# Altium integrated library Mastermind Devices.IntLib: 910 symbols (part 2 of 6) (continued)
## HC-ZH1.5-6AW
designator CN?
1x6P 6P P=1.5mm Wire To Board Connector ROHS; Manufacturer: HCTL(华灿天禄); Add into BOM: yes; Pitch: 1.5mm; Reference Series: ZH; Number of PINs Per Row: 6; Current Rating (Max): 1A; Rated Voltage (Max): 100V; Plastic Material: PBT; Flame Retardant Rating: UL94V-0; Supplementary Features: K-leg punch; Z-Height of the Board: 3.7mm; X-Length of Bottom Edge on Board (Spacing Line): 10.5mm; Symbol: HC-ZH1.5-6AW; Device: HC-ZH1.5-6AW; LCSC Part Name: 1x6P 间距:1.5mm 弯插 系列:ZH; Supplier Part: C2845569; Manufacturer Part: HC-ZH1.5-6AW; Supplier Footprint: 弯插,P=1.5mm; JLCPCB Part Class: Extended Part; Datasheet: https://atta.szlcsc.com/upload/public/pdf/source/20230711/CEA84C90BC30863458C9BDB0466F53F6.pdf; Supplier: LCSC; Convert to PCB: yes; Pins Structure: 1x6P; Mounting Style: Bend insert; Number of Pins: 6P; Number of Rows: 1; Row Spacing: -; Contact Material: Brass; Contact Plating: Tin; Operating Temperature Range: -25℃~+85℃; Colour: -; Y-Width of Bottom Edge on Board: -
footprint CONN-TH_6P-P1.50_HCTL_C-ZH1.5-6AW
3D model CONN-TH_6P-P1.50_HCTL_C-ZH1.5-6AW
pins: 1, 2, 3, 4, 5, 6

## HCPL3120
designator U?
Opto Gate Driver; Manufacturer: TOSHIBA; Manufacturer Part: TLP250(TP1,F); Supplier: LCSC; Supplier Part: C41664; spicePre: U; spiceSymbolName: TLP250(TP1,F)
footprint DIL08-ROUND
pins: 1, 2, 3, 4, 5 GND, 6, 7, 8 VCC

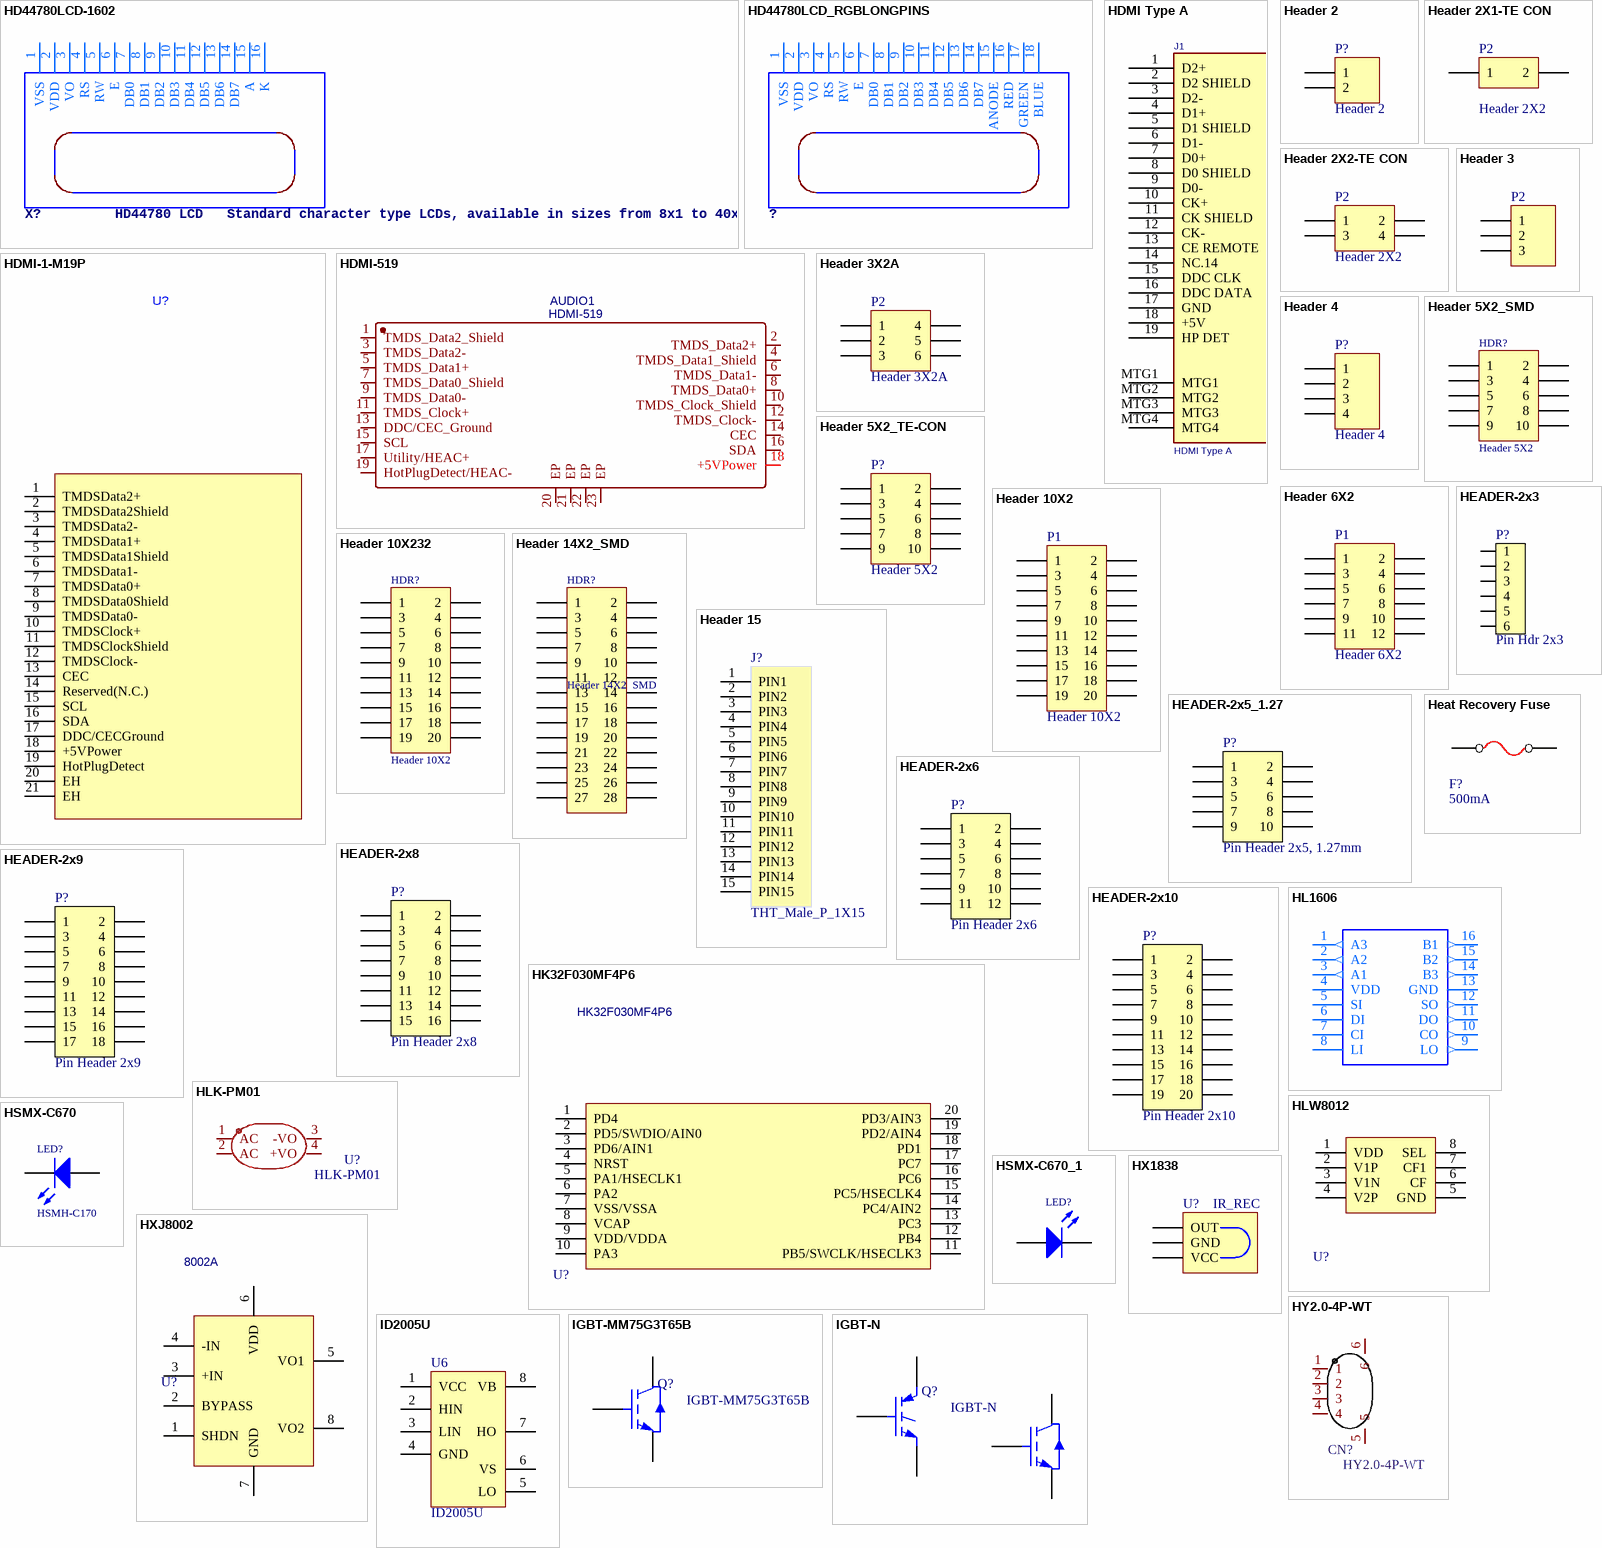
[diagram p14: symbols HD44780LCD-1602 to IGBT-N]

## HD44780LCD-1602
designator X?, comment HD44780 LCD   Standard character type LCDs, available in sizes from 8x1 to 40x4!
footprint LCD1602
pins: 1 VSS (oe), 2 VDD (oe), 3 VO, 4 RS, 5 RW, 6 E, 7 DB0, 8 DB1, 9 DB2, 10 DB3, 11 DB4, 12 DB5, 13 DB6, 14 DB7, 15 A, 16 K

## HD44780LCD_RGBLONGPINS
designator ?
footprint LCD1602-RGB
pins: 1 VSS (oe), 2 VDD (oe), 3 VO, 4 RS, 5 RW, 6 E, 7 DB0, 8 DB1, 9 DB2, 10 DB3, 11 DB4, 12 DB5, 13 DB6, 14 DB7, 15 ANODE, 16 RED, 17 GREEN, 18 BLUE

## HDMI Type A
designator J1
CONN RCPT 19POS HDMI RT ANG SMD; Manufacturer: Molex Connector Corporation; Manufacturer Part Number: 47151-0001; .Checked PCB: MM; Number of Positions: 19; Pitch: 0.50mm (.020"); Value: 47151-0001; Gender: Receptacle; .Version: V1.1 - Changed holes to slots; .Checked SCH: MM; Category: Connectors, Interconnects; Connector Type: HDMI; Family: USB, IEEE-1394 (Firewire), DVI, HDMI; Operating Temperature: -20°C to +85°C; Price 1k [$]: 1.74610; Supplier: Digikey; Supplier Part Number: WM19086CT-ND; Supplier 1: Digi-Key; Supplier Part Number 1: WM19086CT-ND; RoHS: RoHS Compliant; Stock 1: 2756; Pricing 1: 1=3.1, 10=2.57, 50=2.1456, 100=1.9034 (USD); Number of Contacts: 19; Specifications: -; Mounting Type: Surface Mount, Right Angle, Horizontal; Features: Detent Lock; Packaging: Cut Tape (CT); Ingress Protection: -; ComponentLink1URL: http://www.molex.com/pdm_docs/sd/471510001_sd.pdf; ComponentLink1Description: http://www.molex.com/pdm_docs/sd/471510001_sd.pdf
footprint HDMI Type-A
pins: 1 D2+, 2 D2 SHIELD, 3 D2-, 4 D1+, 5 D1 SHIELD, 6 D1-, 7 D0+, 8 D0 SHIELD, 9 D0-, 10 CK+, 11 CK SHIELD, 12 CK-, 13 CE REMOTE, 14 NC.14, 15 DDC CLK, 16 DDC DATA, 17 GND, 18 +5V, 19 HP DET, MTG1, MTG2, MTG3, MTG4

## HDMI-1-M19P
designator U?
footprint HDMI-SMD_BX-HDMI-1-M19P
pins: 1 TMDSData2+, 2 TMDSData2Shield, 3 TMDSData2-, 4 TMDSData1+, 5 TMDSData1Shield, 6 TMDSData1-, 7 TMDSData0+, 8 TMDSData0Shield, 9 TMDSData0-, 10 TMDSClock+, 11 TMDSClockShield, 12 TMDSClock-, 13 CEC, 14 Reserved(N.C.), 15 SCL, 16 SDA, 17 DDC/CECGround, 18 +5VPower, 19 HotPlugDetect, 20 EH, 21 EH

## HDMI-519
designator AUDIO1
Manufacturer: SOFNG(硕方); Contributor: LCSC; Supplier: LCSC; Supplier Part: C136421; Manufacturer Part: HDMI-519; JLCPCB Part Class: Extended Part; spicePre: A; spiceSymbolName: HDMI-519
footprint HDMI-SMD_19P-P0.40-H-F_HDMI-519
pins: 1 TMDS_Data2_Shield, 2 TMDS_Data2+, 3 TMDS_Data2-, 4 TMDS_Data1_Shield, 5 TMDS_Data1+, 6 TMDS_Data1-, 7 TMDS_Data0_Shield, 8 TMDS_Data0+, 9 TMDS_Data0-, 10 TMDS_Clock_Shield, 11 TMDS_Clock+, 12 TMDS_Clock-, 13 DDC/CEC_Ground, 14 CEC, 15 SCL, 16 SDA, 17 Utility/HEAC+, 18 +5VPower, 19 HotPlugDetect/HEAC-, 20 EP, 21 EP, 22 EP, 23 EP

## Header 2
designator P?
Header, 2-Pin; LatestRevisionDate: 17-Jul-2002; LatestRevisionNote: Re-released for DXP Platform.; Publisher: Altium Limited
footprint HDR1X2 (Connector; Header; 2 Position)
pins: 1, 2

## Header 2X1-TE CON
designator P2, comment Header 2X2
Header, 2-Pin, Dual row; LatestRevisionDate: 17-Jul-2002; LatestRevisionNote: Re-released for DXP Platform.; Publisher: Altium Limited
footprint HDR2X1-TE-CON (Connector; Header; 5x2 Position)
pins: 1, 2

## Header 2X2-TE CON
designator P2, comment Header 2X2
Header, 2-Pin, Dual row; LatestRevisionDate: 17-Jul-2002; LatestRevisionNote: Re-released for DXP Platform.; Publisher: Altium Limited
footprint HDR2X2-TE-CON (Connector; Header; 5x2 Position)
pins: 1, 2, 3, 4

## Header 3
designator P2  (value not drawn)
Header, 3-Pin; LatestRevisionDate: 17-Jul-2002; LatestRevisionNote: Re-released for DXP Platform.; Publisher: Altium Limited
footprint HDR1X3 (Connector; Header; 3 Position)
signal-integrity model Connector
footprint HDR1X3 - JUMP (Connector; Header; 3 Position)
pins: 1, 2, 3

## Header 3X2A
designator P2
Header, 3-Pin, Dual row; LatestRevisionDate: 17-Jul-2002; LatestRevisionNote: Re-released for DXP Platform.; Publisher: Altium Limited
signal-integrity model Connector
footprint HDR_2x3-SMD - 2.0
footprint HDR_2x3-SMD-2.54
footprint HDR2X3_1MM (Connector; Header; 3x2 Position)
pins: 1, 2, 3, 4, 5, 6

## Header 4
designator P?
Header, 4-Pin; LatestRevisionDate: 17-Jul-2002; LatestRevisionNote: Re-released for DXP Platform.; Publisher: Altium Limited
footprint JST-PH-4-THM
footprint 4PIN_SMD
footprint HDR1X4 (Connector; Header; 4 Position)
footprint HDR1X4 - 2mm (Connector; Header; 4 Position)
pins: 1, 2, 3, 4

## Header 5X2_SMD
designator HDR?, comment Header 5X2
Header, 5-Pin, Dual row; Revision: 17-Jul-2002: Re-released for DXP Platform.
footprint HDR2X5_LP
signal-integrity model Connector
3D model 10_pin_box_male (PCB3D Model)
footprint DIP10_2SIDED
footprint IDC10_2SIDED
pins: 1, 2, 3, 4, 5, 6, 7, 8, 9, 10

## Header 5X2_TE-CON
designator P?, comment Header 5X2
Header, 5-Pin, Dual row TE  Connectivity; LatestRevisionDate: 17-Jul-2002; LatestRevisionNote: Re-released for DXP Platform.; Publisher: Altium Limited
footprint HDR2X5 (Connector; Header; 5x2 Position)
signal-integrity model Connector
pins: 1, 2, 3, 4, 5, 6, 7, 8, 9, 10

## Header 6X2
designator P1
Header, 6-Pin, Dual row; LatestRevisionDate: 17-Jul-2002; LatestRevisionNote: Re-released for DXP Platform.; Publisher: Altium Limited
footprint HDR2X6 (Connector; Header; 6x2 Position)
signal-integrity model Connector
footprint DIP12_2sided
footprint HDR_2x6 - SMD - 2.0
footprint HDR_2x6 - SMD - 2.54
footprint HDR2X6_2mm (Connector; Header; 6x2 Position)
pins: 1, 2, 3, 4, 5, 6, 7, 8, 9, 10, 11, 12

## Header 10X2
designator P1
Header, 10-Pin, Dual row; LatestRevisionDate: 17-Jul-2002; LatestRevisionNote: Re-released for DXP Platform.; Publisher: Altium Limited
footprint HDR2X10
signal-integrity model Connector
pins: 1, 2, 3, 4, 5, 6, 7, 8, 9, 10, 11, 12, 13, 14, 15, 16, 17, 18, 19, 20

## Header 10X232
designator HDR?, comment Header 10X2
Header, 10-Pin, Dual row; Revision: July-2002: Re-released for DXP Platform.
footprint HDR2X10
signal-integrity model Connector
3D model HDR10X2 (PCB3D Model)
pins: 1, 2, 3, 4, 5, 6, 7, 8, 9, 10, 11, 12, 13, 14, 15, 16, 17, 18, 19, 20

## Header 14X2_SMD
designator HDR?, comment Header 14X2  SMD
Header, 5-Pin, Dual row; Revision: 17-Jul-2002: Re-released for DXP Platform.
signal-integrity model Connector
3D model 10_pin_box_male (PCB3D Model)
footprint DIP28_2SIDED
pins: 1, 2, 3, 4, 5, 6, 7, 8, 9, 10, 11, 12, 13, 14, 15, 16, 17, 18, 19, 20, 21, 22, 23, 24, 25, 26, 27, 28

## Header 15
designator J?  Name: THT_Male_P_1X15
Header, 15-Pin; LatestRevisionDate: 17-Jul-2002; LatestRevisionNote: Re-released for DXP Platform.; Publisher: Altium Limited
footprint HDR1X15 (Connector; Header; 15 Position)
signal-integrity model Connector
pins: 1 PIN1, 2 PIN2, 3 PIN3, 4 PIN4, 5 PIN5, 6 PIN6, 7 PIN7, 8 PIN8, 9 PIN9, 10 PIN10, 11 PIN11, 12 PIN12, 13 PIN13, 14 PIN14, 15 PIN15

## HEADER-2x3
designator P?, comment Pin Hdr 2x3
Pin Header 2x3, 2.54mm (100mil) SMD; Part Number: Pin Header 2x3 SMD; Manufacturer: WCON; Manufacturer Part Number: 1125-1203S0M116R1; 2nd source part number: TSM-103-01-L-DV; Artikkelnr Noca: 55010007; Artikkelnr Simpro: N.A.; Datasheet: \\hizz\pro\app9717\Datasheet\connectores\W-CON\1125-12XXXXMXXXXX.PDF; Footprint Doc: HDR_2x3-SMD; LatestRevisionDate: 2016-01-22; Pin Count: 6; Publisher: Nordic Semiconductor; Published: 2016-01-22; Value: Pin Hdr 2x3; Note: SMD; Supplier: Cabcon; Supplier part number: 1125-1203S0M116R1; 2nd source Supplier: Samtec
footprint HDR_2x3-SMD
pins: 1, 2, 3, 4, 5, 6

## HEADER-2x5_1.27
designator P?, comment Pin Header 2x5, 1.27mm
Pin Header 2x5, 1.27mm (50mil), SMD, Keying Shroud; Part Number: Pin Header 2x5 SMD, 1.27mm, KS; Manufacturer: WCON; Manufacturer Part Number: 3132-10MS0BK00R1; 2nd source part number: FTSH-105-01-F-DV-K; Artikkelnr Noca: 55010009; Artikkelnr Simpro: N.A.; Datasheet: \\hizz\pro\app9717\Datasheet\connectores\W-CON\3132-XXMXXBK00XX.pdf; Footprint Doc: HDR_2x5-SMD-1.27mm; LatestRevisionDate: 2016-04-21; Pin Count: 10; Publisher: Nordic Semiconductor; Published: 2016-01-22; Value: Pin Header 2x5, 1.27mm; Note: *; Supplier: Cabcon; Supplier part number: 3132-10MS0BK00R1; 2nd source Supplier: Samtec
footprint HDR_2x5-SMD-1.27mm-K
pins: 1, 2, 3, 4, 5, 6, 7, 8, 9, 10

## HEADER-2x6
designator P?, comment Pin Header 2x6
Pin Header 2x6, 2.54mm (100mil); Note: Not mounted; Artikkelnr Noca: N.A.; Part Number: Pin Header 2x6; Manufacturer: *; Manufacturer Part Number: *; Datasheet: *; Footprint Doc: HDR_2x6; LatestRevisionDate: 2014-07-04; Pin Count: 12; Publisher: Nordic Semiconductor; Published: 2009-12-12; Value: Pin Header 2x6; Supplier: *; Supplier part number: *; 2nd source Supplier: *; 2nd source part number: *; Artikkelnr Simpro: N.A.
footprint HDR_2x6
pins: 1, 2, 3, 4, 5, 6, 7, 8, 9, 10, 11, 12

## HEADER-2x8
designator P?, comment Pin Header 2x8
Pin Header 2x8, 2.54mm (100mil); Note: Not mounted; Artikkelnr Noca: N.A.; Part Number: Pin Header 2x8; Manufacturer: *; Manufacturer Part Number: *; Datasheet: *; Footprint Doc: HDR_2x8; LatestRevisionDate: 2009-12-12; Pin Count: 16; Publisher: Nordic Semiconductor; Published: 2009-12-12; Value: Pin Header 2x8; Supplier: *; Supplier part number: *; 2nd source Supplier: *; 2nd source part number: *; Artikkelnr Simpro: N.A.
footprint HDR_2x8
pins: 1, 2, 3, 4, 5, 6, 7, 8, 9, 10, 11, 12, 13, 14, 15, 16

## HEADER-2x9
designator P?, comment Pin Header 2x9
Pin Header 2x9, 2.54mm (100mil); Artikkelnr Noca: N.A.; Part Number: Pin Header 2x9; Manufacturer: *; Manufacturer Part Number: *; Datasheet: *; Footprint Doc: HDR_2x9; LatestRevisionDate: 2011-07-06; Pin Count: 18; Publisher: Nordic Semiconductor; Published: 2011-07-06; Value: Pin Header 2x9; Note: *; Supplier: *; Supplier part number: *; 2nd source Supplier: *; 2nd source part number: *; Artikkelnr Simpro: N.A.
footprint HDR_2x9
pins: 1, 2, 3, 4, 5, 6, 7, 8, 9, 10, 11, 12, 13, 14, 15, 16, 17, 18

## HEADER-2x10
designator P?, comment Pin Header 2x10
Pin Header 2x10, 2.54mm (100mil); Note: Not mounted; Artikkelnr Noca: N.A.; Part Number: Pin Header 2x10; Manufacturer: *; Manufacturer Part Number: *; Datasheet: *; Footprint Doc: HDR_2x10; LatestRevisionDate: 2014-07-04; Pin Count: 20; Publisher: Nordic Semiconductor; Published: 2009-12-12; Value: Pin Header 2x10; Supplier: *; Supplier part number: *; 2nd source Supplier: *; 2nd source part number: *; Artikkelnr Simpro: N.A.
footprint HDR_2x10
pins: 1, 2, 3, 4, 5, 6, 7, 8, 9, 10, 11, 12, 13, 14, 15, 16, 17, 18, 19, 20

## Heat Recovery Fuse
designator F?  value 500mA
footprint 0411V
footprint FUSE
footprint FUSE - Long
footprint 0207/2V
footprint Fuse-SMD
footprint 1812
footprint R1206-NO
pins: 1, 2

## HK32F030MF4P6
designator U?
Manufacturer: HK(航顺); Contributor: LCSC; Supplier: LCSC; Supplier Part: C707444; Manufacturer Part: HK32F030MF4P6; JLCPCB Part Class: Extended Part; spicePre: U; spiceSymbolName: HK32F030MF4P6
footprint TSSOP-20_L6.5-W4.4-P0.65-LS6.4-BL
pins: 1 PD4, 2 PD5/SWDIO/AIN0, 3 PD6/AIN1, 4 NRST, 5 PA1/HSECLK1, 6 PA2, 7 VSS/VSSA, 8 VCAP, 9 VDD/VDDA, 10 PA3, 11 PB5/SWCLK/HSECLK3, 12 PB4, 13 PC3, 14 PC4/AIN2, 15 PC5/HSECLK4, 16 PC6, 17 PC7, 18 PD1, 19 PD2/AIN4, 20 PD3/AIN3

## HL1606
designator ?
footprint SO16
pins: 1 A3 (out), 2 A2 (out), 3 A1 (out), 4 VDD (power), 5 SI, 6 DI, 7 CI, 8 LI, 9 LO (out), 10 CO (out), 11 DO (out), 12 SO (out), 13 GND (power), 14 B3 (out), 15 B2 (out), 16 B1 (out)

## HLK-PM01
designator U?
Manufacturer: HI-LINK(海凌科); Add into BOM: yes; Symbol: HLK-PM01; Device: HLK-PM01; LCSC Part Name: HLK-PM01; Supplier Part: C209903; Manufacturer Part: HLK-PM01; Supplier Footprint: 插件; JLCPCB Part Class: Extended Part; Datasheet: https://atta.szlcsc.com/upload/public/pdf/source/20220421/8C2E290B3E1C64DAE99DB0B33492E42C.pdf; Supplier: LCSC; Convert to PCB: yes
footprint PWRM-TH_HLK-PM01
pins: 1 AC, 2 AC, 3 -VO, 4 +VO

## HLW8012
designator U?
footprint SOP8
pins: 1 VDD (power), 2 V1P, 3 V1N, 4 V2P, 5 GND, 6 CF, 7 CF1, 8 SEL (power)

## HSMX-C670
designator LED?, comment HSMH-C170
Typical RED GaAs SMD LED Agilent make; AEMS Code: 2610081; Revision: July-2002: Re-released for DXP Platform.
footprint SMD _LED
simulation model LED1 (Diode)
3D model LED (PCB3D Model)
pins: 1 A, 2 K

## HSMX-C670_1
designator LED?, comment HSMH-C170  (value not drawn)
Typical RED GaAs SMD LED Agilent make; AEMS Code: 2610081; Revision: July-2002: Re-released for DXP Platform.
footprint SMD _LED
simulation model LED1 (Diode)
3D model LED (PCB3D Model)
pins: 1 A, 2 K

## HX1838
designator U?
Header, 3-Pin; LatestRevisionDate: 17-Jul-2002; LatestRevisionNote: Re-released for DXP Platform.; Publisher: Altium Limited
footprint ISO203 (Connector; Header; 3 Position)
pins: 1 OUT, 2 GND, 3 VCC
text: IR_REC

## HXJ8002
designator U?, comment 8002A
Manufacturer: IDCHIP(英锐芯); Contributor: LCSC; Supplier: LCSC; Supplier Part: C329448; Manufacturer Part: 8002A; JLCPCB Part Class: Extended Part; spicePre: U; spiceSymbolName: 8002A
footprint SOIC-8E (SOIC, 8-Leads, Body 4.90x3.90mm, Pitch 1.27mm, IPC Medium Density)
pins: 1 SHDN, 2 BYPASS, 3 +IN, 4 -IN, 5 VO1, 6 VDD, 7 GND, 8 VO2

## HY2.0-4P-WT
designator CN?
Manufacturer: CAX(创都); Add into BOM: yes; Pins Structure: 1x4P; Pitch: 2mm; Number of PINs Per Row: 4; Symbol: HY2.0-4P-WT; Device: HY2.0-4P-WT; Supplier: LCSC; Supplier Part: C722729; Manufacturer Part: HY2.0-4P-WT; JLCPCB Part Class: Extended Part; LCSC Part Name: 1x4P 间距:2mm 卧贴; Supplier Footprint: SMD,P=2mm,卧贴; Datasheet: https://atta.szlcsc.com/upload/public/pdf/source/20200903/C722727_BBF50559C2ABBA609D4F52DD7C381BF6.pdf; Convert to PCB: yes; Mounting Style: 卧贴; Reference Series: -; Number of Pins: 4P; Number of Rows: 1; Row Spacing: -; Current Rating (Max): -; Operating Temperature Range: -
footprint CONN-SMD_HY2.0-4P
pins: 1, 2, 3, 4, 5, 6

## ID2005U
designator U6
SOP-8 Gate Drivers ROHS; Manufacturer: EG(屹晶微); Symbol: EG3013S; Add into BOM: yes; Device: EG3013S; Supplier Part: C5138297; Manufacturer Part: ID2005U; Supplier Footprint: SOP-8; JLCPCB Part Class: Extended Part; Datasheet: https://atta.szlcsc.com/upload/public/pdf/source/20240401/B57332368F1567A90B75A8EC20454C1B.pdf; Supplier: LCSC; Convert to PCB: yes
footprint SOP8
pins: 1 VCC, 2 HIN, 3 LIN, 4 GND, 5 LO, 6 VS, 7 HO, 8 VB

## IGBT-MM75G3T65B
designator Q?
N-Channel  650V 75A; Published: 8-Jun-2000; LatestRevisionDate: 17-Jul-2002; LatestRevisionNote: Re-released for DXP Platform.; DatasheetVersion: PD-9.684A; PackageReference: TO-247; Publisher: Altium Limited; PackageDescription: SIP with Mounting Hole; 3 Leads; Body 20 x 15.6 x 5 mm (typ); Pitch 5.45 mm; Code_JEDEC: TO-247-AC; ComponentLink1Description: Manufacturer Link; ComponentLink1URL: http://www.irf.com/
footprint TO-247 (SIP with Mounting Hole; 3 Leads; Body 20 x 15.6 x 5 mm (typ); Pitch 5.45 mm)
pins: 1 G, 2 C, 3 E

## IGBT-N
designator Q?
Insulated Gate Bipolar Transistor (N-Channel); Published: 8-Jun-2000; LatestRevisionDate: 17-Jul-2002; LatestRevisionNote: Re-released for DXP Platform.; DatasheetVersion: PD-9.684A; PackageReference: TO-247; Publisher: Altium Limited; PackageDescription: SIP with Mounting Hole; 3 Leads; Body 20 x 15.6 x 5 mm (typ); Pitch 5.45 mm; Code_JEDEC: TO-247-AC; ComponentLink1Description: Manufacturer Link; ComponentLink1URL: http://www.irf.com/
pins: 1 G, 1 G, 2 C, 2 C, 3 E, 3 E

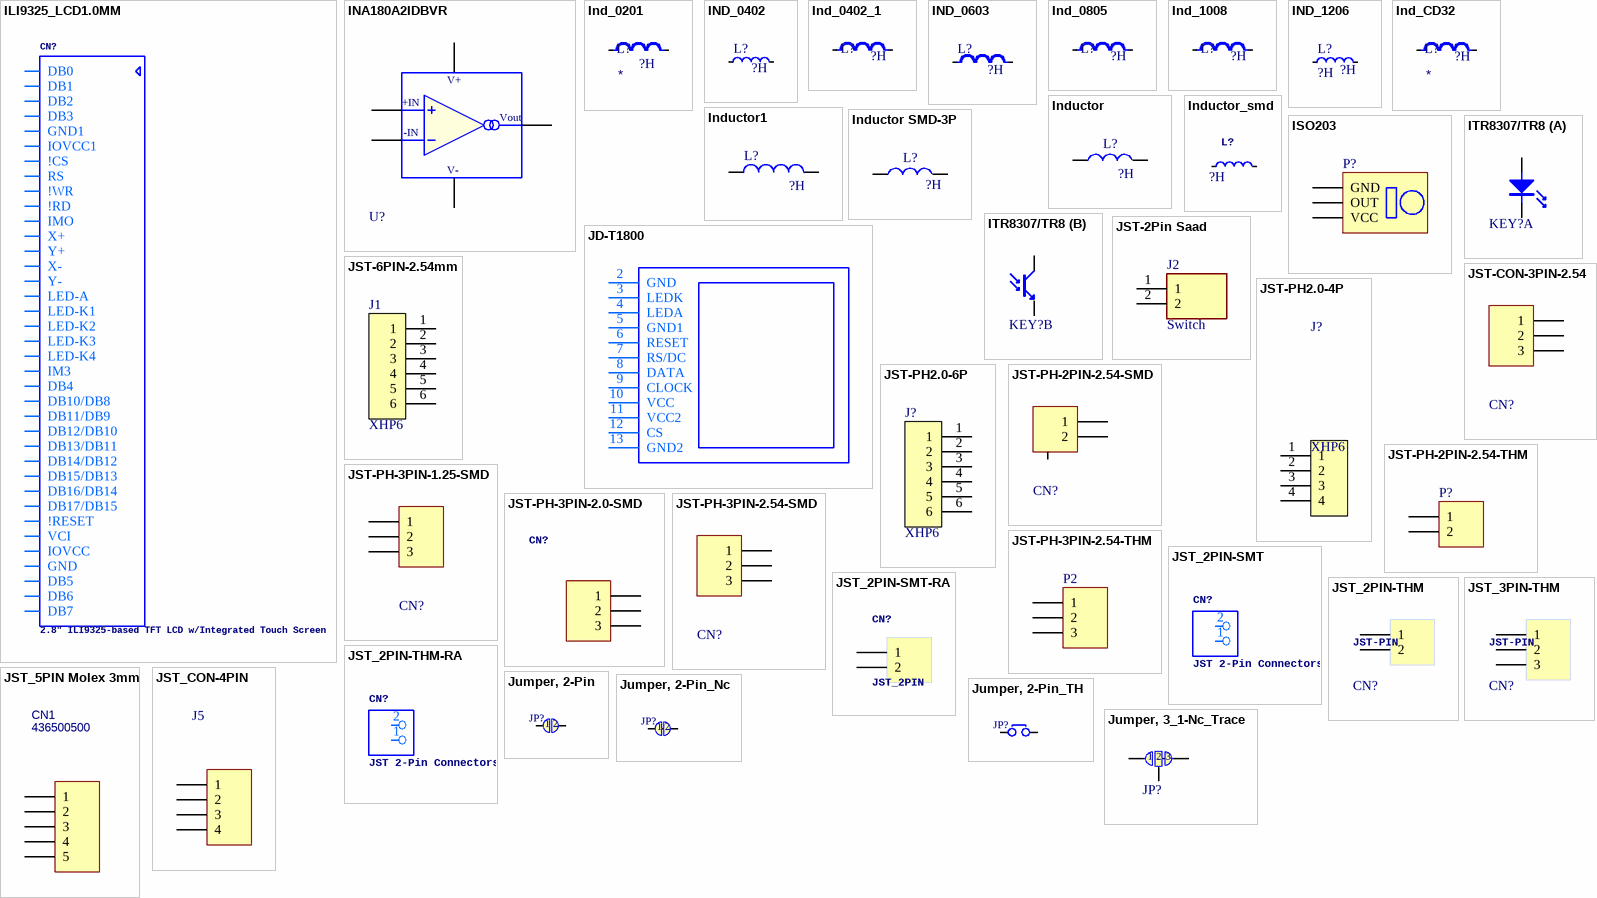
[diagram p15: symbols ILI9325_LCD1.0MM to Jumper, 3_1-Nc_Trace]

## ILI9325_LCD1.0MM
designator CN?, comment 2.8" ILI9325-based TFT LCD w/Integrated Touch Screen
footprint ILI9325_28INCH_TS
pins: 1 DB0, 2 DB1, 3 DB2, 4 DB3, 5 GND1 (power), 6 IOVCC1 (power), 7 !CS, 8 RS, 9 !WR, 10 !RD, 11 IMO, 12 X+, 13 Y+, 14 X-, 15 Y-, 16 LED-A, 17 LED-K1, 18 LED-K2, 19 LED-K3, 20 LED-K4, 21 IM3, 22 DB4, 23 DB10/DB8, 24 DB11/DB9, 25 DB12/DB10, 26 DB13/DB11, 27 DB14/DB12, 28 DB15/DB13, 29 DB16/DB14, 30 DB17/DB15, 31 !RESET, 32 VCI (power), 33 IOVCC (power), 34 GND (power), 35 DB5, 36 DB6, 37 DB7

## INA180A2IDBVR
designator U?, comment Shunt Current  (value not drawn)
footprint SOT23-6
pins: 1 OA, 2 GND, 3 A+, 4 A-, 5 VCC
text: V+; +IN; Vout; -IN; V-

## Ind_0201
designator L?  Vaule: ?H
Inductor
footprint IND_0201
pins: 1, 2

## IND_0402
designator L?  value ?H  (hidden comment: *)
Inductor, 320mA, ±5%; Part Number: L0402-15n; Manufacturer: Taiyo Yuden; Manufacturer Part Number: HK100515NJ-T; 2nd source part number: 658-1328; Note: High frequency chip inductor ±10%; Artikkelnr Noca: 33029323; Artikkelnr Simpro: N.A.; LatestRevisionDate: 2012-09-19; Pin Count: 2; Publisher: Nordic Semiconductor; Published: 2010-07-12; Supplier: Digi-Key; Datasheet: http://www.yuden.co.jp/productdata/catalog/en/mlci04_e.pdf; Supplier part number: 587-1521-1-ND; 2nd source Supplier: Farnell; Footprint Doc: 0402
footprint INDC1005X04L
pins: 1, 2

## Ind_0402_1
designator L?, comment value ?H  (hidden comment: H0402)
Inductor
footprint IND_0402
pins: 1, 2

## IND_0603
designator L?  value ?H  (hidden comment: *)
Inductor, 80mA, ±10%; Part Number: L0603-10µ; Manufacturer: Taiyo Yuden; Manufacturer Part Number: LBMF1608T100K; 2nd source part number: 178-6105; Note: LBMF1608T100K 10µH 80mA 0603; Artikkelnr Noca: 33029314; Artikkelnr Simpro: N.A.; Datasheet: http://www.yuden.co.jp/ut/product/pdf/elb2_e.pdf; LatestRevisionDate: 2012-09-19; Pin Count: 2; Publisher: Nordic Semiconductor; Published: 2010-02-24; Supplier: Digi-Key; Supplier part number: 587-1714-1-ND; 2nd source Supplier: Farnell; Footprint Doc: 0603
footprint INDC1608X06L
pins: 1, 2

## Ind_0805
designator L?  value ?H  (hidden comment: *)
Inductor
footprint INDC-0805
pins: 1, 2

## Ind_1008
designator L?, comment value ?H  (hidden comment: H1008)
Inductor
footprint IND_1008
pins: 1, 2

## IND_1206
designator L?, comment ?H
Inductor, 80mA, ±10%; Value: ?H
pins: 1, 2

## Ind_CD32
designator L?  value ?H
Power Inductor
footprint IND_CD32
pins: 1, 2